# Altium footprint library MyPcbLib.PcbLib: 233 footprints (part 12 of 15)
Each footprint in its own frame and in the unit in brackets; x right, y up, seen from the top. Pads: shape width x height; smd on the part's side, far side on the other; paste and mask are expansions set on the pad; w line width, h text height; cw(c..) or ccw(c..) is an arc to the next point about the centre after c.
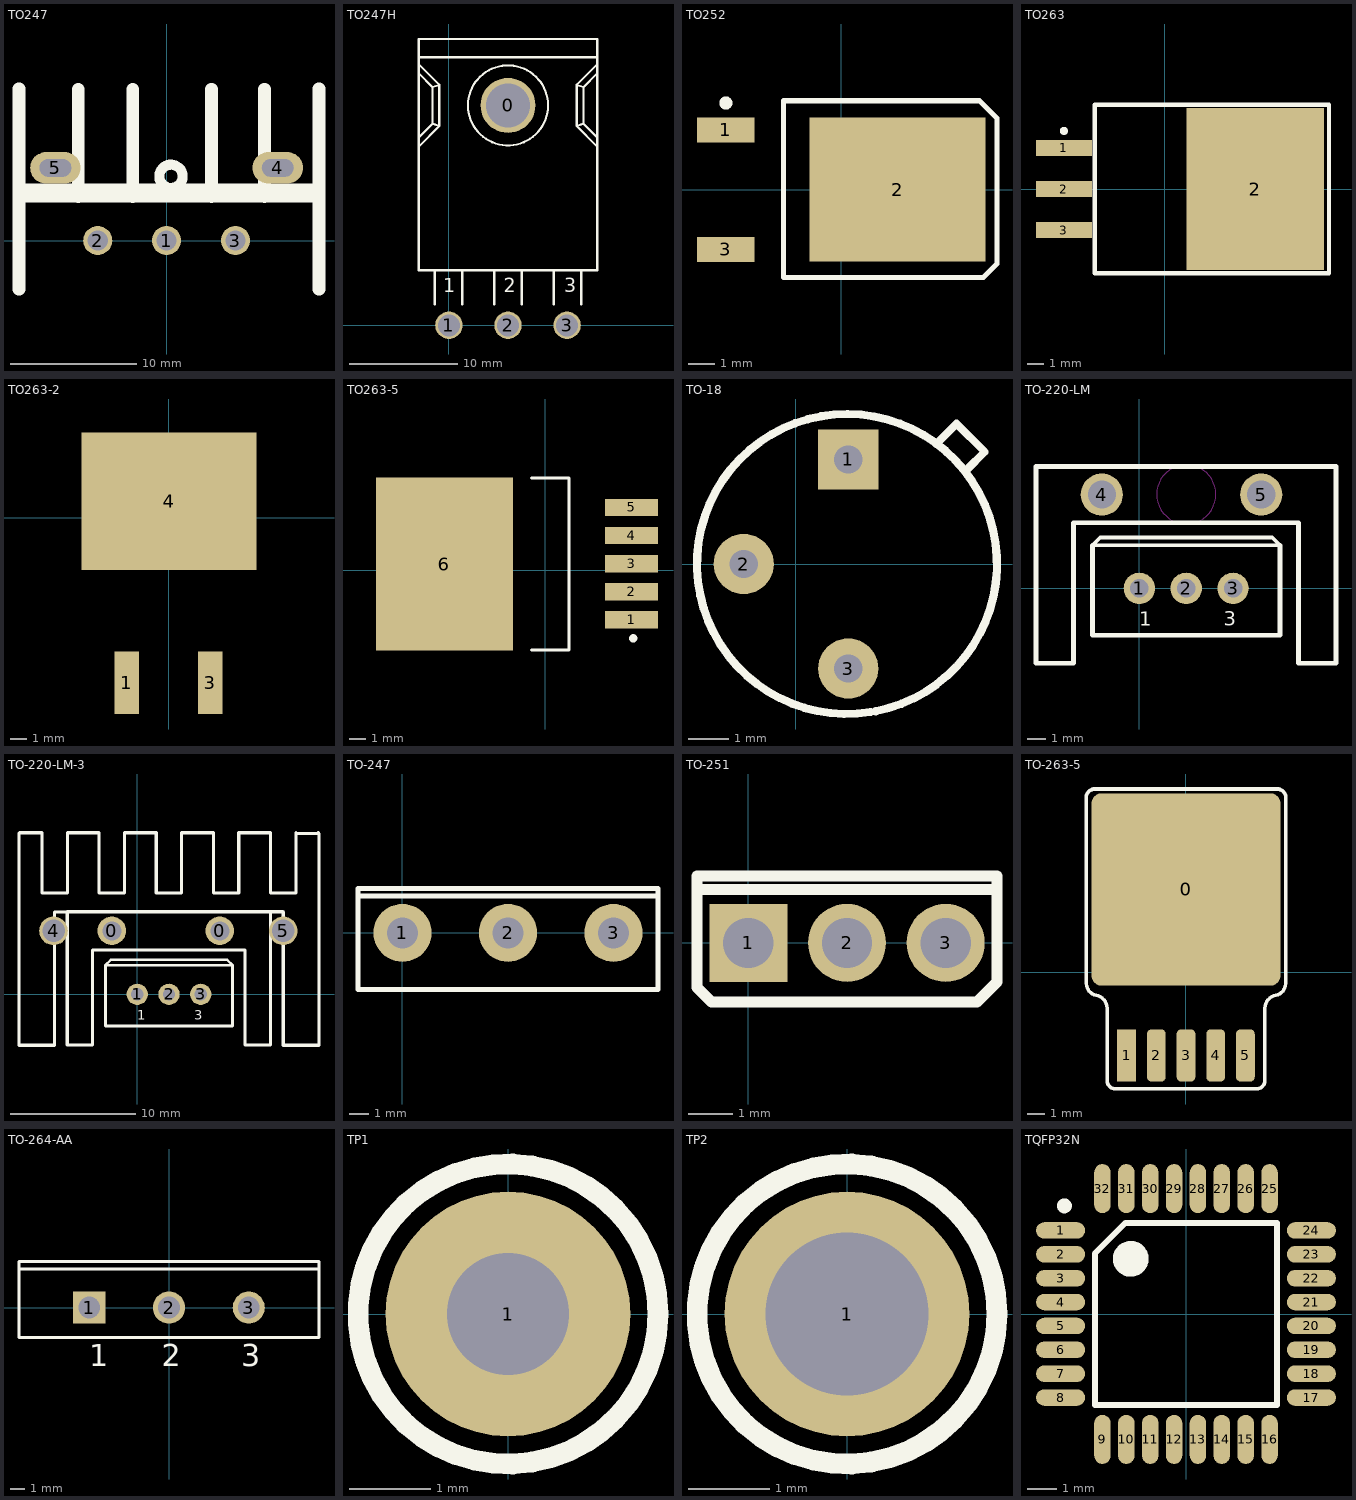
[diagram p11: the footprints below, top view; thin cyan lines are the x and y axes]

## TO247 [mm]
pads (5):
  round 2.3 hole 1.6: 1(0,0) 2(-5.45,0) 3(5.45,0)
  oval 4x2.5 hole 1.4 slot 2.5 at 0 deg: 4(8.8,5.75) 5(-8.8,5.75)
Top Overlay:
  circle w0.8: c0.345,5.08 r0.925
  lines w1: -11.684,-3.849 -11.684,12.006 ; -6.985,3.486 -6.985,11.986 ; -2.667,3.486 -2.667,11.986 ; 3.556,3.486 3.556,11.986 ; 7.747,3.486 7.747,11.986 ; 12.065,-3.849 12.065,12.006
  lines w1.5: -11.43,3.75 11.43,3.75
Mechanical 15:
  lines w0.1: -0.5,0 0.5,0 ; 0,-0.5 0,0.5
3D body "User Library-TO_247.STEP": height 25, standoff -11.05, extent -7.9,-2.337 7.9,2.973

## TO247H [mil]
pads (4):
  round 200 hole 160: 0(215,800)
  round 100 hole 80: 1(0,0) 2(215,0) 3(430,0)
Top Overlay:
  circle w7.87: c215,800 r145.6
  lines w7.87: -110,650 -35,725 ; -110,683.33 -60,733.33 ; -110,916.67 -60,866.67 ; -110,950 -35,875 ; -110,975 540,975 ; -51.67,75 -51.67,200 ; 48.33,75 48.33,200 ; 165,75 165,200 ; 265,75 265,200 ; 381.67,75 381.67,200 ; 481.67,75 481.67,200 ; 540,650 465,725 ; 540,683.33 490,733.33 ; 540,916.67 490,866.67 ; 540,950 465,875 ; -60,733.33 -35,725 ; -60,733.33 -60,866.67 ; -60,866.67 -35,875 ; -35,725 -35,875 ; 465,725 490,733.33 ; 465,725 465,875 ; 465,875 490,866.67 ; 490,733.33 490,866.67 ; -110,200 -110,1041.67 540,1041.67 540,200 -110,200
  text "3" at 420,120 h50
  text "2" at 200,120 h50
  text "1" at -20,120 h50
3D body "User Library-TO-247H.STEP": height 153.54, standoff -314.96, extent -90,0 520.24,1000

## TO252 [mm] "D-PAK  / SOT-428"
height 2.38
pads (3):
  rect 2.2x0.95 smd: 1(-4.4,2.28) 3(-4.4,-2.28)
  rect 6.7x5.5 smd: 2(2.15,0)
Top Overlay:
  circle w0.25: c-4.4,3.305 r0.125
  lines w0.1: -2.2,-3.35 -2.2,3.35
  lines w0.2: -2.2,-3.35 5.418,-3.35 5.944,-2.824 5.944,2.725 5.278,3.391 -2.2,3.391 -2.2,-3.35
3D body "D-PAK.STEP": height 2.31, standoff 0, extent -4.475,-3.3 4.775,3.3

## TO263 [mm] "D2PAK936"
height 4.5
pads (4):
  rect 3.45x1 smd: 1(-6.225,2.54) 2(-6.225,0) 3(-6.225,-2.54)
  rect 8.5x10 smd: 2(5.588,0)
Top Overlay:
  circle w0.25: c-6.225,3.59 r0.125
  lines w0.254: -4.318,-5.207 10.16,-5.207 10.16,5.207 -4.318,5.207 -4.318,-5.207
3D body "SW3dPS-TO263-3.STEP": height 4.88, standoff 0.08, extent -6.819,-5.054 8.851,4.946

## TO263-2 [mil]
pads (3):
  rect 59.06x150 smd: 1(-101,-397) 3(100,-397)
  rect 420x330 smd: 4(1,40)
3D body "User Library-DPAK.step": height 193.9, standoff -3.66, extent -200,-441.47 200,159.47

## TO263-5 [mm]
pads (6):
  rect 3.2x1.05 smd: 1(5.207,-2.997) 2(5.207,-1.297) 3(5.207,0.403) 4(5.207,2.103) 5(5.207,3.803)
  rect 8.3x10.45 smd: 6(-6.117,0.381)
Top Overlay:
  circle w0.25: c5.309,-4.115 r0.125
  lines w0.2: -0.83,-4.819 1.42,-4.819 1.42,5.581 -0.83,5.581
3D body "TO263-5.STEP": height 4.78, standoff -0.02, extent -9.537,-4.644 6.133,5.356

## TO-18 [mm]
pads (3):
  rect 1.5x1.5 hole 0.7: 1(1.302,2.603)
  round 1.5 hole 0.7: 2(-1.302,0) 3(1.302,-2.603)
Top Overlay:
  lines w0.2: 3.492,2.984 4,3.492 4.699,2.794 4.255,2.349
  lines w0.203: 1.856,-3.689 cw(c1.27,0) 1.985,-3.666
3D body "TO-18_2N2222.step": height 6.6, standoff -1.79, extent -1.53,-2.8 4.078,2.808

## TO-220-LM [mm]
pads (5):
  round 1.7 hole 1: 1(0,0) 2(2.54,0) 3(5.08,0)
  round 2.286 hole 1.524: 4(-2.032,5.08) 5(6.604,5.08)
Top Overlay:
  lines w0.2: -2.54,2.328 7.62,2.328 7.197,2.752 -2.117,2.752 -2.54,2.328
  lines w0.254: -2.54,2.328 -2.54,-2.529 -2.529,-2.54 7.609,-2.54 7.62,-2.529 7.62,2.328 ; 10.657,3.556 10.657,6.604 ; 10.657,6.604 10.657,-4.064 8.625,-4.064 8.625,3.556 -3.567,3.556 -3.567,-4.064 -5.599,-4.064 -5.599,1.016 -5.599,3.556 -5.599,6.604 10.657,6.604
  text "3" at 4.572,-2.032 h0.76
  text "1" at 0,-2.032 h0.76
Keep-Out Layer:
  circle w0.025: c2.545,5.094 r1.606
3D body "User Library-Package T0-220AB With Heatsing Vertical Mount-1.STEP": height 21.07, standoff -4.86, extent -5.96,-5.775 11.04,4.445

## TO-220-LM-3 [mil]
height 1181.1
pads (7):
  round 90 hole 60: 0(-80,200) 0(260,200)
  round 66.93 hole 39.37: 1(0,0) 2(100,0) 3(200,0)
  round 90 hole 70.87: 4(-263.72,199.65) 5(459.82,199.65)
Top Overlay:
  lines w7.87: -100,91.67 -83.33,108.33 283.33,108.33 300,91.67 -100,91.67
  lines w10: -372.44,379.39 -372.44,507.14 ; -372.44,391.91 -372.44,507.14 ; -100,91.67 -100,-99.56 -99.56,-100 299.56,-100 300,-99.56 300,91.67 ; 419.56,140 419.56,260 ; 459.82,119.65 459.82,199.65 ; 570.28,508.93 572.44,506.77 ; 572.44,387.75 572.44,506.77 ; -372.44,507.14 -372.44,-160.61 -260.18,-160.61 -260.18,259.65 -220.78,259.65 -220.44,260 ; -372.44,507.14 -370.65,508.93 -300.18,508.93 -300.18,319.39 -220.18,319.39 -220.18,508.93 -120.18,508.93 -120.18,319.39 -40.18,319.39 -40.18,508.93 59.82,508.93 59.82,319.39 139.82,319.39 139.82,508.93 239.82,508.93 239.82,319.39 319.82,319.39 319.82,508.93 399.82,508.93 419.82,508.93 419.82,319.39 499.82,319.39 499.82,508.93 501.97,506.77 572.44,506.77 ; -220.44,260 419.56,260 ; -220.44,260 -220.44,140 -220.44,40 -220.44,-160 -140.44,-160 -140.44,140 339.56,140 339.56,-160 419.56,-160 419.56,260 ; 419.56,260 459.47,260 459.82,259.65 459.82,-160.61 572.44,-160.61 572.44,506.77
  text "1" at 0,-80 h30
  text "3" at 180,-80 h30

## TO-247 [mm]
height 0.9
pads (3):
  round 3 hole 1.6: 1(0,0) 2(5.45,0) 3(10.9,0)
Top Overlay:
  lines w0.254: -2.297,1.905 13.07,1.905 ; -2.297,-2.921 -2.297,2.286 13.197,2.286 13.197,-2.921 -2.297,-2.921
3D body "TO247.STEP": height 26.16, standoff -15.75, extent -2.644,-3.192 13.616,2.108

## TO-251 [mil]
height 35.43
pads (3):
  rect 70x70 hole 45: 1(0,0)
  round 70 hole 45: 2(88.5,0) 3(177,0)
Top Overlay:
  lines w10: -46,48 222,48 ; -46,-40 -33,-53 205,-53 223,-35 223,60 -46,60 -46,-40
3D body "to-251aa.step": height 388.43, standoff -281.5, extent -38.95,-44 216.95,46.55

## TO-263-5 [mm]
pads (6):
  rrect10% 10.8x11 smd: 0(0,4.75)
  rect 1.07x3 smd: 1(-3.4,-4.75)
  rrect50% 1.07x3 smd: 2(-1.7,-4.75) 3(0,-4.75) 4(1.7,-4.75) 5(3.4,-4.75)
Top Overlay:
  lines w0.2: -4.512,-6.122 ccw(c-4.028,-6.181) -4.125,-6.659 ; 4.125,-6.659 ccw(c4.028,-6.181) 4.512,-6.122
  lines w0.203: -5.7,10.05 -5.7,-0.53 ccw(c-5.005,-0.615) -5.145,-1.301 cw(c-5.306,-2.084) -4.512,-2.181 -4.512,-6.122 ; -5.7,10.109 cw(c-5.222,10.011) -5.299,10.493 ; -5.3,10.5 5.3,10.5 ; -4.125,-6.659 4.125,-6.659 ; 4.512,-6.122 4.512,-2.181 cw(c5.306,-2.084) 5.145,-1.301 ccw(c5.005,-0.615) 5.7,-0.53 5.7,10.05 ; 5.299,10.493 cw(c5.222,10.011) 5.7,10.109
3D body "SW3dPS-LTC DD-PAK.STEP": height 4.48, standoff 0, extent -5.137,-4.801 5.087,9.55

## TO-264-AA [mm] "SIP with Mounting Hole; 3 Leads; Body 26 x 20 x 5 mm (typ); Pitch 5.45 mm"
height 29
pads (3):
  rect 2.2x2.2 hole 1.5: 1(-5.45,0)
  round 2.2 hole 1.5: 2(0,0) 3(5.45,0)
Top Overlay:
  lines w0.2: -10.25,2.65 10.25,2.65 ; -10.25,-2.05 -10.25,3.15 10.25,3.15 10.25,-2.05 -10.25,-2.05
  text "3" at 4.942,-4.025 h1.5
  text "2" at -0.508,-4.025 h1.5
  text "1" at -5.45,-4.025 h1.5
3D body "to264.STEP": height 34, standoff -5, extent -10.025,-2.712 9.975,2.388

## TP1 [mm]
pads (1):
  round 3 hole 1.5: 1(0,0)
Top Overlay:
  circle w0.254: c0,0 r1.84

## TP2 [mm]
pads (1):
  round 3 hole 2: 1(0,0)
Top Overlay:
  circle w0.254: c0,0 r1.84

## TQFP32N [mm] "TQFP, 32-Leads, Body 9.0x9.0mm (max), Pitch 0.80mm, IPC Medium Density"
height 1.2
pads (32):
  oval 1.65x0.55 smd: 1(-4.202,2.8) 2(-4.202,2) 3(-4.202,1.2) 4(-4.202,0.4) 5(-4.202,-0.4) 6(-4.202,-1.2) 7(-4.202,-2) 8(-4.202,-2.8) 17(4.202,-2.8) 18(4.202,-2) 19(4.202,-1.2) 20(4.202,-0.4) 21(4.202,0.4) 22(4.202,1.2) 23(4.202,2) 24(4.202,2.8)
  oval 0.55x1.65 smd: 9(-2.8,-4.202) 10(-2,-4.202) 11(-1.2,-4.202) 12(-0.4,-4.202) 13(0.4,-4.202) 14(1.2,-4.202) 15(2,-4.202) 16(2.8,-4.202) 25(2.8,4.202) 26(2,4.202) 27(1.2,4.202) 28(0.4,4.202) 29(-0.4,4.202) 30(-1.2,4.202) 31(-2,4.202) 32(-2.8,4.202)
Top Overlay:
  circle w0.25: c-4.075,3.625 r0.125
  circle w0.6: c-1.85,1.85 r0.3
  lines w0.2: -3.048,-3.048 3.048,-3.048 3.048,3.048 -2.032,3.048 -3.048,2.032 -3.048,-3.048
3D body "User Library-TQFP32-1.step": height 1.1, standoff 0, extent -4.509,-4.483 4.509,4.534